# Altium footprint library Connector_Samtec_HLE_THT.PcbLib: 141 footprints (part 8 of 9)
Each footprint in its own frame and in the unit in brackets; x right, y up, seen from the top. Pads: shape width x height; smd on the part's side, far side on the other; paste and mask are expansions set on the pad; w line width, h text height; cw(c..) or ccw(c..) is an arc to the next point about the centre after c.
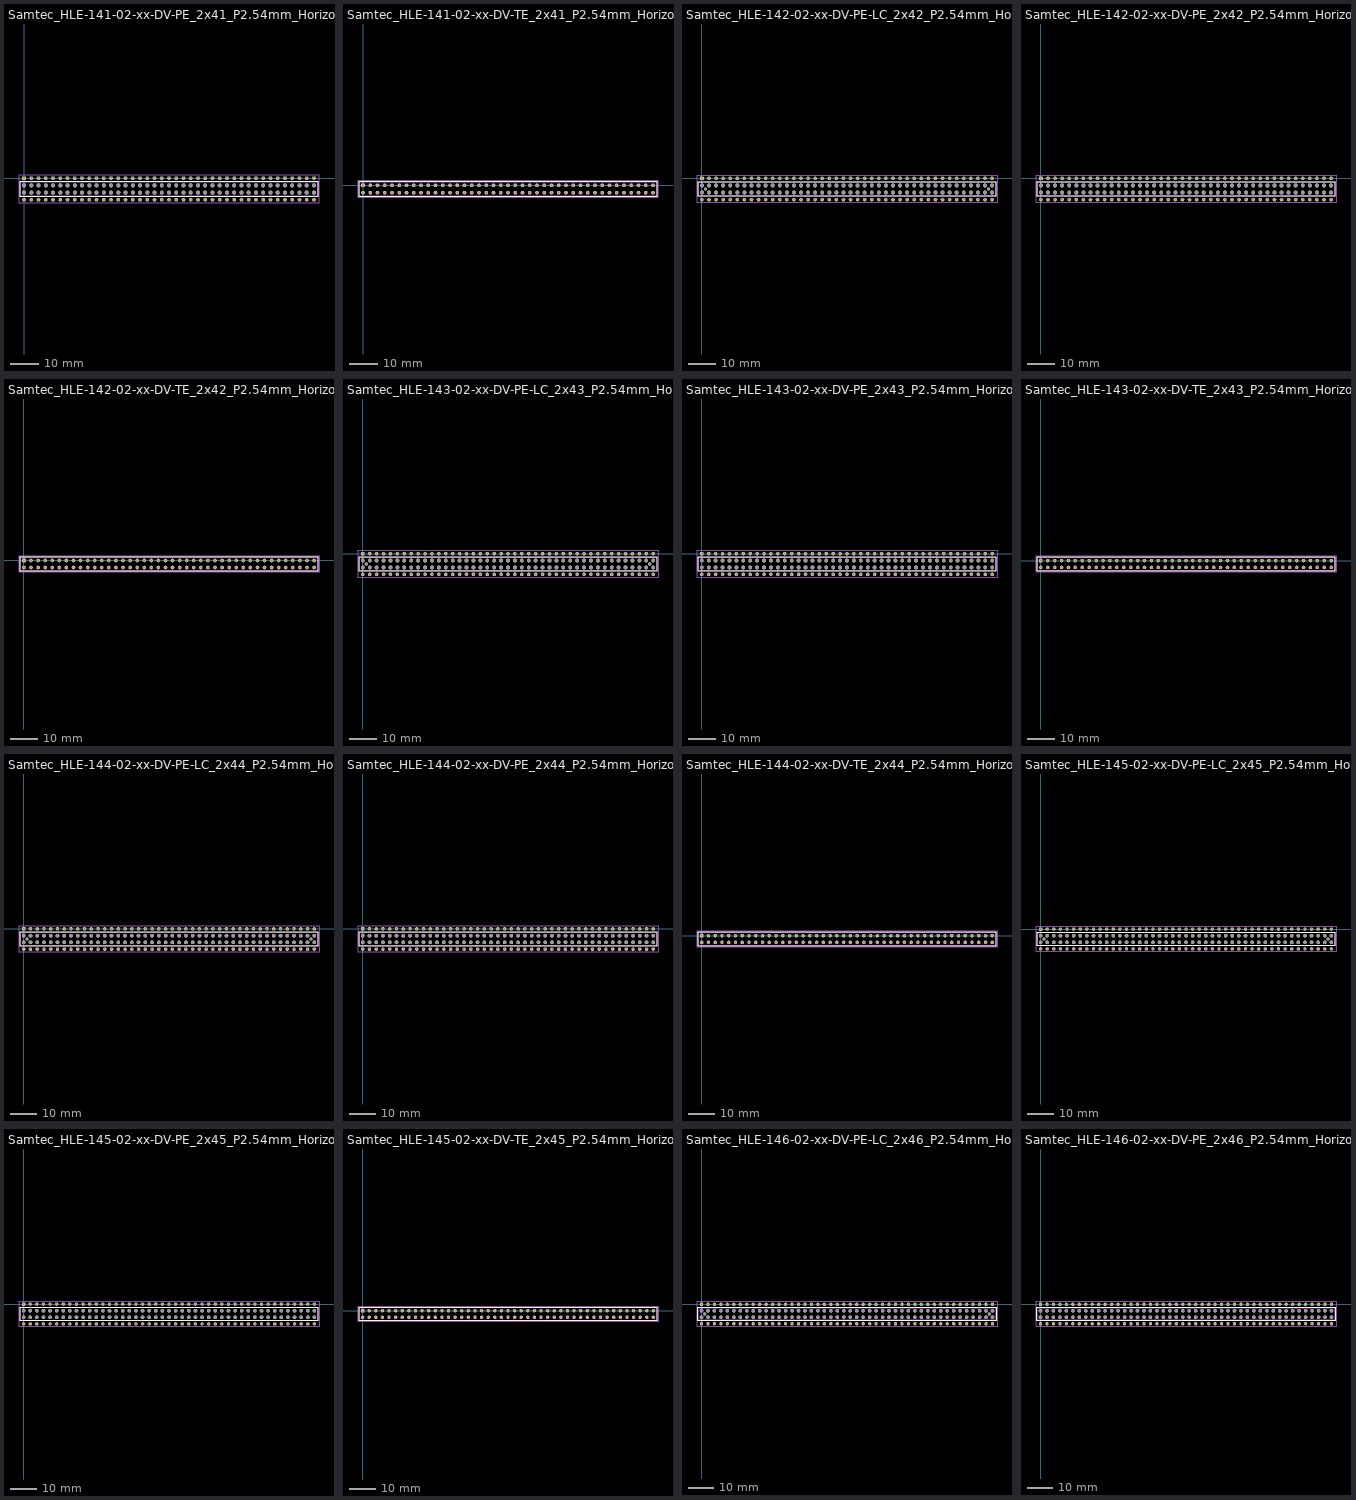
[diagram p7: the footprints below, top view; thin cyan lines are the x and y axes]

## Samtec_HLE-141-02-xx-DV-PE_2x41_P2.54mm_Horizontal [mm]
pads (164):
  rrect19% 1.31x1.31 hole 0.71: 1(0,0)
  round 1.31 hole 0.71: 2(0,-7.62) 3(2.54,0) 4(2.54,-7.62) 5(5.08,0) 6(5.08,-7.62) 7(7.62,0) 8(7.62,-7.62) 9(10.16,0) 10(10.16,-7.62) 11(12.7,0) 12(12.7,-7.62) 13(15.24,0) 14(15.24,-7.62) 15(17.78,0) 16(17.78,-7.62) 17(20.32,0) 18(20.32,-7.62) 19(22.86,0) 20(22.86,-7.62) 21(25.4,0) 22(25.4,-7.62) 23(27.94,0) 24(27.94,-7.62) 25(30.48,0) 26(30.48,-7.62) 27(33.02,0) 28(33.02,-7.62) 29(35.56,0) 30(35.56,-7.62) 31(38.1,0) 32(38.1,-7.62) 33(40.64,0) 34(40.64,-7.62) 35(43.18,0) 36(43.18,-7.62) 37(45.72,0) 38(45.72,-7.62) 39(48.26,0) 40(48.26,-7.62) 41(50.8,0) 42(50.8,-7.62) 43(53.34,0) 44(53.34,-7.62) 45(55.88,0) 46(55.88,-7.62) 47(58.42,0) 48(58.42,-7.62) 49(60.96,0) 50(60.96,-7.62) 51(63.5,0) 52(63.5,-7.62) 53(66.04,0) 54(66.04,-7.62) 55(68.58,0) 56(68.58,-7.62) 57(71.12,0) 58(71.12,-7.62) 59(73.66,0) 60(73.66,-7.62) 61(76.2,0) 62(76.2,-7.62) 63(78.74,0) 64(78.74,-7.62) 65(81.28,0) 66(81.28,-7.62) 67(83.82,0) 68(83.82,-7.62) 69(86.36,0) 70(86.36,-7.62) 71(88.9,0) 72(88.9,-7.62) 73(91.44,0) 74(91.44,-7.62) 75(93.98,0) 76(93.98,-7.62) 77(96.52,0) 78(96.52,-7.62) 79(99.06,0) 80(99.06,-7.62) 81(101.6,0) 82(101.6,-7.62)
  round 1.4 hole 1.4: Un1(83.82,-2.54) Un2(58.42,-2.54) Un3(15.24,-2.54) Un4(71.12,-5.08) Un5(10.16,-2.54) Un6(5.08,-2.54) Un7(96.52,-2.54) Un8(45.72,-5.08) Un9(88.9,-5.08) Un10(50.8,-5.08) Un11(101.6,-5.08) Un12(88.9,-2.54) Un13(35.56,-5.08) Un14(60.96,-5.08) Un15(55.88,-2.54) Un16(30.48,-5.08) Un17(33.02,-2.54) Un18(22.86,-5.08) Un19(93.98,-2.54) Un20(53.34,-2.54) Un21(86.36,-5.08) Un22(48.26,-2.54) Un23(7.62,-5.08) Un24(78.74,-5.08) Un25(96.52,-5.08) Un26(2.54,-5.08) Un27(45.72,-2.54) Un28(0,-2.54) Un29(12.7,-2.54) Un30(81.28,-5.08) Un31(68.58,-5.08) Un32(93.98,-5.08) Un33(43.18,-2.54) Un34(7.62,-2.54) Un35(91.44,-5.08) Un36(66.04,-2.54) Un37(43.18,-5.08) Un38(101.6,-2.54) Un39(48.26,-5.08) Un40(73.66,-2.54) Un41(27.94,-5.08) Un42(55.88,-5.08) Un43(76.2,-2.54) Un44(76.2,-5.08) Un45(71.12,-2.54) Un46(12.7,-5.08) Un47(17.78,-5.08) Un48(17.78,-2.54) Un49(63.5,-2.54) Un50(2.54,-2.54) Un51(68.58,-2.54) Un52(81.28,-2.54) Un53(5.08,-5.08) Un54(38.1,-5.08) Un55(40.64,-2.54) Un56(63.5,-5.08) Un57(86.36,-2.54) Un58(25.4,-5.08) Un59(20.32,-5.08) Un60(10.16,-5.08) Un61(38.1,-2.54) Un62(40.64,-5.08) Un63(78.74,-2.54) Un64(35.56,-2.54) Un65(99.06,-5.08) Un66(50.8,-2.54) Un67(53.34,-5.08) Un68(27.94,-2.54) Un69(0,-5.08) Un70(60.96,-2.54) Un71(99.06,-2.54) Un72(30.48,-2.54) Un73(73.66,-5.08) Un74(66.04,-5.08) Un75(25.4,-2.54) Un76(33.02,-5.08) Un77(58.42,-5.08) Un78(83.82,-5.08) Un79(91.44,-2.54) Un80(20.32,-2.54) Un81(22.86,-2.54) Un82(15.24,-5.08)
F.SilkS:
  lines w0.12: -1.38,-6.46 -1.38,-1.16 102.98,-1.16 102.98,-6.46 -1.38,-6.46
F.CrtYd:
  lines w0.05: -1.77,-8.78 -1.77,1.16 103.37,1.16 103.37,-8.78 -1.77,-8.78
F.Fab:
  lines w0.1: -0.5,-1.27 0,-1.977 0.5,-1.27 ; -1.27,-6.35 -1.27,-1.27 102.87,-1.27 102.87,-6.35 -1.27,-6.35
  text "'.Designator'" at 46.753,-6.49 h1

## Samtec_HLE-141-02-xx-DV-TE_2x41_P2.54mm_Horizontal [mm]
pads (82):
  rrect19% 1.31x1.31 hole 0.71: 1(0,0)
  round 1.31 hole 0.71: 2(0,-2.54) 3(2.54,0) 4(2.54,-2.54) 5(5.08,0) 6(5.08,-2.54) 7(7.62,0) 8(7.62,-2.54) 9(10.16,0) 10(10.16,-2.54) 11(12.7,0) 12(12.7,-2.54) 13(15.24,0) 14(15.24,-2.54) 15(17.78,0) 16(17.78,-2.54) 17(20.32,0) 18(20.32,-2.54) 19(22.86,0) 20(22.86,-2.54) 21(25.4,0) 22(25.4,-2.54) 23(27.94,0) 24(27.94,-2.54) 25(30.48,0) 26(30.48,-2.54) 27(33.02,0) 28(33.02,-2.54) 29(35.56,0) 30(35.56,-2.54) 31(38.1,0) 32(38.1,-2.54) 33(40.64,0) 34(40.64,-2.54) 35(43.18,0) 36(43.18,-2.54) 37(45.72,0) 38(45.72,-2.54) 39(48.26,0) 40(48.26,-2.54) 41(50.8,0) 42(50.8,-2.54) 43(53.34,0) 44(53.34,-2.54) 45(55.88,0) 46(55.88,-2.54) 47(58.42,0) 48(58.42,-2.54) 49(60.96,0) 50(60.96,-2.54) 51(63.5,0) 52(63.5,-2.54) 53(66.04,0) 54(66.04,-2.54) 55(68.58,0) 56(68.58,-2.54) 57(71.12,0) 58(71.12,-2.54) 59(73.66,0) 60(73.66,-2.54) 61(76.2,0) 62(76.2,-2.54) 63(78.74,0) 64(78.74,-2.54) 65(81.28,0) 66(81.28,-2.54) 67(83.82,0) 68(83.82,-2.54) 69(86.36,0) 70(86.36,-2.54) 71(88.9,0) 72(88.9,-2.54) 73(91.44,0) 74(91.44,-2.54) 75(93.98,0) 76(93.98,-2.54) 77(96.52,0) 78(96.52,-2.54) 79(99.06,0) 80(99.06,-2.54) 81(101.6,0) 82(101.6,-2.54)
F.SilkS:
  lines w0.12: -1.38,-3.92 102.98,-3.92 102.98,1.38 -1.38,1.38 -1.38,-3.92
F.CrtYd:
  lines w0.05: -1.77,-4.31 103.37,-4.31 103.37,1.77 -1.77,1.77 -1.77,-4.31
F.Fab:
  lines w0.1: -0.5,1.27 0,0.563 0.5,1.27 ; -1.27,-3.81 102.87,-3.81 102.87,1.27 -1.27,1.27 -1.27,-3.81
  text "'.Designator'" at 46.753,-3.95 h1

## Samtec_HLE-142-02-xx-DV-PE-LC_2x42_P2.54mm_Horizontal [mm]
pads (170):
  rrect19% 1.31x1.31 hole 0.71: 1(0,0)
  round 1.31 hole 0.71: 2(0,-7.62) 3(2.54,0) 4(2.54,-7.62) 5(5.08,0) 6(5.08,-7.62) 7(7.62,0) 8(7.62,-7.62) 9(10.16,0) 10(10.16,-7.62) 11(12.7,0) 12(12.7,-7.62) 13(15.24,0) 14(15.24,-7.62) 15(17.78,0) 16(17.78,-7.62) 17(20.32,0) 18(20.32,-7.62) 19(22.86,0) 20(22.86,-7.62) 21(25.4,0) 22(25.4,-7.62) 23(27.94,0) 24(27.94,-7.62) 25(30.48,0) 26(30.48,-7.62) 27(33.02,0) 28(33.02,-7.62) 29(35.56,0) 30(35.56,-7.62) 31(38.1,0) 32(38.1,-7.62) 33(40.64,0) 34(40.64,-7.62) 35(43.18,0) 36(43.18,-7.62) 37(45.72,0) 38(45.72,-7.62) 39(48.26,0) 40(48.26,-7.62) 41(50.8,0) 42(50.8,-7.62) 43(53.34,0) 44(53.34,-7.62) 45(55.88,0) 46(55.88,-7.62) 47(58.42,0) 48(58.42,-7.62) 49(60.96,0) 50(60.96,-7.62) 51(63.5,0) 52(63.5,-7.62) 53(66.04,0) 54(66.04,-7.62) 55(68.58,0) 56(68.58,-7.62) 57(71.12,0) 58(71.12,-7.62) 59(73.66,0) 60(73.66,-7.62) 61(76.2,0) 62(76.2,-7.62) 63(78.74,0) 64(78.74,-7.62) 65(81.28,0) 66(81.28,-7.62) 67(83.82,0) 68(83.82,-7.62) 69(86.36,0) 70(86.36,-7.62) 71(88.9,0) 72(88.9,-7.62) 73(91.44,0) 74(91.44,-7.62) 75(93.98,0) 76(93.98,-7.62) 77(96.52,0) 78(96.52,-7.62) 79(99.06,0) 80(99.06,-7.62) 81(101.6,0) 82(101.6,-7.62) 83(104.14,0) 84(104.14,-7.62)
  round 1.4 hole 1.4: Un1(10.16,-2.54) Un2(45.72,-5.08) Un3(17.78,-5.08) Un4(48.26,-5.08) Un5(48.26,-2.54) Un6(104.14,-2.54) Un7(73.66,-5.08) Un8(12.7,-5.08) Un9(60.96,-5.08) Un10(43.18,-2.54) Un11(45.72,-2.54) Un12(30.48,-5.08) Un13(68.58,-5.08) Un14(10.16,-5.08) Un15(91.44,-2.54) Un16(55.88,-5.08) Un17(40.64,-5.08) Un18(104.14,-5.08) Un19(50.8,-5.08) Un20(27.94,-5.08) Un21(20.32,-2.54) Un22(93.98,-5.08) Un23(15.24,-2.54) Un24(30.48,-2.54) Un25(38.1,-5.08) Un26(66.04,-5.08) Un28(101.6,-5.08) Un29(25.4,-5.08) Un30(40.64,-2.54) Un31(53.34,-2.54) Un32(101.6,-2.54) Un33(88.9,-2.54) Un34(93.98,-2.54) Un35(78.74,-2.54) Un36(43.18,-5.08) Un37(7.62,-5.08) Un38(99.06,-2.54) Un39(73.66,-2.54) Un40(0,-5.08) Un41(33.02,-2.54) Un42(96.52,-5.08) Un43(76.2,-2.54) Un44(22.86,-2.54) Un45(12.7,-2.54) Un46(83.82,-5.08) Un47(38.1,-2.54) Un48(86.36,-5.08) Un49(35.56,-2.54) Un50(71.12,-5.08) Un51(2.54,-2.54) Un52(22.86,-5.08) Un53(83.82,-2.54) Un55(76.2,-5.08) Un56(86.36,-2.54) Un57(78.74,-5.08) Un58(71.12,-2.54) Un59(27.94,-2.54) Un60(91.44,-5.08) Un61(2.54,-5.08) Un62(5.08,-2.54) Un63(68.58,-2.54) Un64(17.78,-2.54) Un65(88.9,-5.08) Un66(7.62,-2.54) Un67(58.42,-2.54) Un68(53.34,-5.08) Un69(58.42,-5.08) Un70(33.02,-5.08) Un71(35.56,-5.08) Un72(60.96,-2.54) Un73(99.06,-5.08) Un74(25.4,-2.54) Un75(81.28,-5.08) Un76(96.52,-2.54) Un77(0,-2.54) Un78(15.24,-5.08) Un79(20.32,-5.08) Un80(81.28,-2.54) Un81(5.08,-5.08) Un82(63.5,-5.08) Un83(50.8,-2.54) Un84(55.88,-2.54) Un85(63.5,-2.54) Un86(66.04,-2.54)
  round 1.19 hole 1.19: Un27(1.27,-3.81) Un54(102.87,-3.81)
F.SilkS:
  lines w0.12: -1.38,-6.46 -1.38,-1.16 105.52,-1.16 105.52,-6.46 -1.38,-6.46
F.CrtYd:
  lines w0.05: -1.77,-8.78 -1.77,1.16 105.91,1.16 105.91,-8.78 -1.77,-8.78
F.Fab:
  lines w0.1: -0.5,-1.27 0,-1.977 0.5,-1.27 ; -1.27,-6.35 -1.27,-1.27 105.41,-1.27 105.41,-6.35 -1.27,-6.35
  text "'.Designator'" at 48.023,-6.49 h1

## Samtec_HLE-142-02-xx-DV-PE_2x42_P2.54mm_Horizontal [mm]
pads (168):
  rrect19% 1.31x1.31 hole 0.71: 1(0,0)
  round 1.31 hole 0.71: 2(0,-7.62) 3(2.54,0) 4(2.54,-7.62) 5(5.08,0) 6(5.08,-7.62) 7(7.62,0) 8(7.62,-7.62) 9(10.16,0) 10(10.16,-7.62) 11(12.7,0) 12(12.7,-7.62) 13(15.24,0) 14(15.24,-7.62) 15(17.78,0) 16(17.78,-7.62) 17(20.32,0) 18(20.32,-7.62) 19(22.86,0) 20(22.86,-7.62) 21(25.4,0) 22(25.4,-7.62) 23(27.94,0) 24(27.94,-7.62) 25(30.48,0) 26(30.48,-7.62) 27(33.02,0) 28(33.02,-7.62) 29(35.56,0) 30(35.56,-7.62) 31(38.1,0) 32(38.1,-7.62) 33(40.64,0) 34(40.64,-7.62) 35(43.18,0) 36(43.18,-7.62) 37(45.72,0) 38(45.72,-7.62) 39(48.26,0) 40(48.26,-7.62) 41(50.8,0) 42(50.8,-7.62) 43(53.34,0) 44(53.34,-7.62) 45(55.88,0) 46(55.88,-7.62) 47(58.42,0) 48(58.42,-7.62) 49(60.96,0) 50(60.96,-7.62) 51(63.5,0) 52(63.5,-7.62) 53(66.04,0) 54(66.04,-7.62) 55(68.58,0) 56(68.58,-7.62) 57(71.12,0) 58(71.12,-7.62) 59(73.66,0) 60(73.66,-7.62) 61(76.2,0) 62(76.2,-7.62) 63(78.74,0) 64(78.74,-7.62) 65(81.28,0) 66(81.28,-7.62) 67(83.82,0) 68(83.82,-7.62) 69(86.36,0) 70(86.36,-7.62) 71(88.9,0) 72(88.9,-7.62) 73(91.44,0) 74(91.44,-7.62) 75(93.98,0) 76(93.98,-7.62) 77(96.52,0) 78(96.52,-7.62) 79(99.06,0) 80(99.06,-7.62) 81(101.6,0) 82(101.6,-7.62) 83(104.14,0) 84(104.14,-7.62)
  round 1.4 hole 1.4: Un1(63.5,-2.54) Un2(27.94,-5.08) Un3(17.78,-5.08) Un4(2.54,-2.54) Un5(73.66,-5.08) Un6(78.74,-5.08) Un7(76.2,-2.54) Un8(104.14,-2.54) Un9(96.52,-2.54) Un10(93.98,-5.08) Un11(7.62,-5.08) Un12(30.48,-2.54) Un13(55.88,-2.54) Un14(48.26,-5.08) Un15(12.7,-5.08) Un16(71.12,-2.54) Un17(93.98,-2.54) Un18(96.52,-5.08) Un19(68.58,-5.08) Un20(27.94,-2.54) Un21(50.8,-5.08) Un22(25.4,-2.54) Un23(81.28,-2.54) Un24(71.12,-5.08) Un25(83.82,-5.08) Un26(99.06,-2.54) Un27(101.6,-5.08) Un28(40.64,-5.08) Un29(66.04,-5.08) Un30(101.6,-2.54) Un31(0,-5.08) Un32(58.42,-5.08) Un33(15.24,-2.54) Un34(12.7,-2.54) Un35(15.24,-5.08) Un36(58.42,-2.54) Un37(91.44,-5.08) Un38(76.2,-5.08) Un39(38.1,-5.08) Un40(45.72,-2.54) Un41(53.34,-5.08) Un42(81.28,-5.08) Un43(7.62,-2.54) Un44(48.26,-2.54) Un45(88.9,-2.54) Un46(86.36,-2.54) Un47(63.5,-5.08) Un48(99.06,-5.08) Un49(10.16,-2.54) Un50(55.88,-5.08) Un51(43.18,-2.54) Un52(91.44,-2.54) Un53(17.78,-2.54) Un54(5.08,-5.08) Un55(38.1,-2.54) Un56(33.02,-2.54) Un57(20.32,-5.08) Un58(68.58,-2.54) Un59(22.86,-2.54) Un60(22.86,-5.08) Un61(86.36,-5.08) Un62(104.14,-5.08) Un63(30.48,-5.08) Un64(40.64,-2.54) Un65(83.82,-2.54) Un66(43.18,-5.08) Un67(35.56,-5.08) Un68(53.34,-2.54) Un69(66.04,-2.54) Un70(35.56,-2.54) Un71(0,-2.54) Un72(25.4,-5.08) Un73(20.32,-2.54) Un74(2.54,-5.08) Un75(60.96,-2.54) Un76(50.8,-2.54) Un77(10.16,-5.08) Un78(60.96,-5.08) Un79(88.9,-5.08) Un80(45.72,-5.08) Un81(73.66,-2.54) Un82(5.08,-2.54) Un83(78.74,-2.54) Un84(33.02,-5.08)
F.SilkS:
  lines w0.12: -1.38,-6.46 -1.38,-1.16 105.52,-1.16 105.52,-6.46 -1.38,-6.46
F.CrtYd:
  lines w0.05: -1.77,-8.78 105.91,-8.78 105.91,1.16 -1.77,1.16 -1.77,-8.78
F.Fab:
  lines w0.1: -0.5,-1.27 0,-1.977 0.5,-1.27 ; -1.27,-6.35 -1.27,-1.27 105.41,-1.27 105.41,-6.35 -1.27,-6.35
  text "'.Designator'" at 48.023,-6.49 h1

## Samtec_HLE-142-02-xx-DV-TE_2x42_P2.54mm_Horizontal [mm]
pads (84):
  rrect19% 1.31x1.31 hole 0.71: 1(0,0)
  round 1.31 hole 0.71: 2(0,-2.54) 3(2.54,0) 4(2.54,-2.54) 5(5.08,0) 6(5.08,-2.54) 7(7.62,0) 8(7.62,-2.54) 9(10.16,0) 10(10.16,-2.54) 11(12.7,0) 12(12.7,-2.54) 13(15.24,0) 14(15.24,-2.54) 15(17.78,0) 16(17.78,-2.54) 17(20.32,0) 18(20.32,-2.54) 19(22.86,0) 20(22.86,-2.54) 21(25.4,0) 22(25.4,-2.54) 23(27.94,0) 24(27.94,-2.54) 25(30.48,0) 26(30.48,-2.54) 27(33.02,0) 28(33.02,-2.54) 29(35.56,0) 30(35.56,-2.54) 31(38.1,0) 32(38.1,-2.54) 33(40.64,0) 34(40.64,-2.54) 35(43.18,0) 36(43.18,-2.54) 37(45.72,0) 38(45.72,-2.54) 39(48.26,0) 40(48.26,-2.54) 41(50.8,0) 42(50.8,-2.54) 43(53.34,0) 44(53.34,-2.54) 45(55.88,0) 46(55.88,-2.54) 47(58.42,0) 48(58.42,-2.54) 49(60.96,0) 50(60.96,-2.54) 51(63.5,0) 52(63.5,-2.54) 53(66.04,0) 54(66.04,-2.54) 55(68.58,0) 56(68.58,-2.54) 57(71.12,0) 58(71.12,-2.54) 59(73.66,0) 60(73.66,-2.54) 61(76.2,0) 62(76.2,-2.54) 63(78.74,0) 64(78.74,-2.54) 65(81.28,0) 66(81.28,-2.54) 67(83.82,0) 68(83.82,-2.54) 69(86.36,0) 70(86.36,-2.54) 71(88.9,0) 72(88.9,-2.54) 73(91.44,0) 74(91.44,-2.54) 75(93.98,0) 76(93.98,-2.54) 77(96.52,0) 78(96.52,-2.54) 79(99.06,0) 80(99.06,-2.54) 81(101.6,0) 82(101.6,-2.54) 83(104.14,0) 84(104.14,-2.54)
F.SilkS:
  lines w0.12: -1.38,-3.92 105.52,-3.92 105.52,1.38 -1.38,1.38 -1.38,-3.92
F.CrtYd:
  lines w0.05: -1.77,-4.31 105.91,-4.31 105.91,1.77 -1.77,1.77 -1.77,-4.31
F.Fab:
  lines w0.1: -0.5,1.27 0,0.563 0.5,1.27 ; -1.27,-3.81 -1.27,1.27 105.41,1.27 105.41,-3.81 -1.27,-3.81
  text "'.Designator'" at 48.023,-3.95 h1

## Samtec_HLE-143-02-xx-DV-PE-LC_2x43_P2.54mm_Horizontal [mm]
pads (174):
  rrect19% 1.31x1.31 hole 0.71: 1(0,0)
  round 1.31 hole 0.71: 2(0,-7.62) 3(2.54,0) 4(2.54,-7.62) 5(5.08,0) 6(5.08,-7.62) 7(7.62,0) 8(7.62,-7.62) 9(10.16,0) 10(10.16,-7.62) 11(12.7,0) 12(12.7,-7.62) 13(15.24,0) 14(15.24,-7.62) 15(17.78,0) 16(17.78,-7.62) 17(20.32,0) 18(20.32,-7.62) 19(22.86,0) 20(22.86,-7.62) 21(25.4,0) 22(25.4,-7.62) 23(27.94,0) 24(27.94,-7.62) 25(30.48,0) 26(30.48,-7.62) 27(33.02,0) 28(33.02,-7.62) 29(35.56,0) 30(35.56,-7.62) 31(38.1,0) 32(38.1,-7.62) 33(40.64,0) 34(40.64,-7.62) 35(43.18,0) 36(43.18,-7.62) 37(45.72,0) 38(45.72,-7.62) 39(48.26,0) 40(48.26,-7.62) 41(50.8,0) 42(50.8,-7.62) 43(53.34,0) 44(53.34,-7.62) 45(55.88,0) 46(55.88,-7.62) 47(58.42,0) 48(58.42,-7.62) 49(60.96,0) 50(60.96,-7.62) 51(63.5,0) 52(63.5,-7.62) 53(66.04,0) 54(66.04,-7.62) 55(68.58,0) 56(68.58,-7.62) 57(71.12,0) 58(71.12,-7.62) 59(73.66,0) 60(73.66,-7.62) 61(76.2,0) 62(76.2,-7.62) 63(78.74,0) 64(78.74,-7.62) 65(81.28,0) 66(81.28,-7.62) 67(83.82,0) 68(83.82,-7.62) 69(86.36,0) 70(86.36,-7.62) 71(88.9,0) 72(88.9,-7.62) 73(91.44,0) 74(91.44,-7.62) 75(93.98,0) 76(93.98,-7.62) 77(96.52,0) 78(96.52,-7.62) 79(99.06,0) 80(99.06,-7.62) 81(101.6,0) 82(101.6,-7.62) 83(104.14,0) 84(104.14,-7.62) 85(106.68,0) 86(106.68,-7.62)
  round 1.4 hole 1.4: Un1(50.8,-2.54) Un2(78.74,-2.54) Un3(91.44,-2.54) Un4(93.98,-2.54) Un5(38.1,-5.08) Un6(22.86,-2.54) Un7(22.86,-5.08) Un8(20.32,-2.54) Un9(43.18,-2.54) Un10(55.88,-2.54) Un11(55.88,-5.08) Un12(10.16,-2.54) Un13(101.6,-2.54) Un14(88.9,-2.54) Un15(45.72,-5.08) Un16(99.06,-2.54) Un17(81.28,-2.54) Un18(35.56,-5.08) Un19(76.2,-5.08) Un20(58.42,-5.08) Un21(17.78,-2.54) Un22(48.26,-2.54) Un23(68.58,-5.08) Un24(12.7,-5.08) Un25(91.44,-5.08) Un26(104.14,-2.54) Un27(38.1,-2.54) Un28(83.82,-5.08) Un29(10.16,-5.08) Un30(53.34,-5.08) Un31(33.02,-2.54) Un32(60.96,-2.54) Un35(20.32,-5.08) Un36(40.64,-2.54) Un37(43.18,-5.08) Un38(40.64,-5.08) Un39(63.5,-2.54) Un40(35.56,-2.54) Un41(86.36,-5.08) Un42(7.62,-5.08) Un43(0,-5.08) Un44(25.4,-5.08) Un45(68.58,-2.54) Un46(5.08,-5.08) Un47(81.28,-5.08) Un48(60.96,-5.08) Un49(30.48,-2.54) Un50(104.14,-5.08) Un51(15.24,-2.54) Un52(12.7,-2.54) Un53(66.04,-2.54) Un54(96.52,-5.08) Un55(7.62,-2.54) Un56(45.72,-2.54) Un57(86.36,-2.54) Un58(0,-2.54) Un59(58.42,-2.54) Un60(73.66,-2.54) Un61(106.68,-5.08) Un62(15.24,-5.08) Un63(63.5,-5.08) Un64(88.9,-5.08) Un65(106.68,-2.54) Un66(27.94,-5.08) Un67(2.54,-5.08) Un68(78.74,-5.08) Un69(71.12,-2.54) Un70(71.12,-5.08) Un71(50.8,-5.08) Un72(48.26,-5.08) Un73(96.52,-2.54) Un74(30.48,-5.08) Un75(5.08,-2.54) Un76(66.04,-5.08) Un77(73.66,-5.08) Un78(33.02,-5.08) Un79(76.2,-2.54) Un80(101.6,-5.08) Un81(17.78,-5.08) Un82(99.06,-5.08) Un83(83.82,-2.54) Un84(25.4,-2.54) Un85(2.54,-2.54) Un86(27.94,-2.54) Un87(93.98,-5.08) Un88(53.34,-2.54)
  round 1.19 hole 1.19: Un33(1.27,-3.81) Un34(105.41,-3.81)
F.SilkS:
  lines w0.12: -1.38,-6.46 -1.38,-1.16 108.06,-1.16 108.06,-6.46 -1.38,-6.46
F.CrtYd:
  lines w0.05: -1.77,-8.78 -1.77,1.16 108.45,1.16 108.45,-8.78 -1.77,-8.78
F.Fab:
  lines w0.1: -0.5,-1.27 0,-1.977 0.5,-1.27 ; -1.27,-6.35 -1.27,-1.27 107.95,-1.27 107.95,-6.35 -1.27,-6.35
  text "'.Designator'" at 49.293,-6.49 h1

## Samtec_HLE-143-02-xx-DV-PE_2x43_P2.54mm_Horizontal [mm]
pads (172):
  rrect19% 1.31x1.31 hole 0.71: 1(0,0)
  round 1.31 hole 0.71: 2(0,-7.62) 3(2.54,0) 4(2.54,-7.62) 5(5.08,0) 6(5.08,-7.62) 7(7.62,0) 8(7.62,-7.62) 9(10.16,0) 10(10.16,-7.62) 11(12.7,0) 12(12.7,-7.62) 13(15.24,0) 14(15.24,-7.62) 15(17.78,0) 16(17.78,-7.62) 17(20.32,0) 18(20.32,-7.62) 19(22.86,0) 20(22.86,-7.62) 21(25.4,0) 22(25.4,-7.62) 23(27.94,0) 24(27.94,-7.62) 25(30.48,0) 26(30.48,-7.62) 27(33.02,0) 28(33.02,-7.62) 29(35.56,0) 30(35.56,-7.62) 31(38.1,0) 32(38.1,-7.62) 33(40.64,0) 34(40.64,-7.62) 35(43.18,0) 36(43.18,-7.62) 37(45.72,0) 38(45.72,-7.62) 39(48.26,0) 40(48.26,-7.62) 41(50.8,0) 42(50.8,-7.62) 43(53.34,0) 44(53.34,-7.62) 45(55.88,0) 46(55.88,-7.62) 47(58.42,0) 48(58.42,-7.62) 49(60.96,0) 50(60.96,-7.62) 51(63.5,0) 52(63.5,-7.62) 53(66.04,0) 54(66.04,-7.62) 55(68.58,0) 56(68.58,-7.62) 57(71.12,0) 58(71.12,-7.62) 59(73.66,0) 60(73.66,-7.62) 61(76.2,0) 62(76.2,-7.62) 63(78.74,0) 64(78.74,-7.62) 65(81.28,0) 66(81.28,-7.62) 67(83.82,0) 68(83.82,-7.62) 69(86.36,0) 70(86.36,-7.62) 71(88.9,0) 72(88.9,-7.62) 73(91.44,0) 74(91.44,-7.62) 75(93.98,0) 76(93.98,-7.62) 77(96.52,0) 78(96.52,-7.62) 79(99.06,0) 80(99.06,-7.62) 81(101.6,0) 82(101.6,-7.62) 83(104.14,0) 84(104.14,-7.62) 85(106.68,0) 86(106.68,-7.62)
  round 1.4 hole 1.4: Un1(30.48,-2.54) Un2(17.78,-5.08) Un3(91.44,-2.54) Un4(12.7,-2.54) Un5(20.32,-5.08) Un6(33.02,-2.54) Un7(20.32,-2.54) Un8(38.1,-2.54) Un9(99.06,-2.54) Un10(78.74,-5.08) Un11(43.18,-5.08) Un12(78.74,-2.54) Un13(38.1,-5.08) Un14(53.34,-5.08) Un15(27.94,-2.54) Un16(73.66,-2.54) Un17(10.16,-2.54) Un18(45.72,-5.08) Un19(53.34,-2.54) Un20(43.18,-2.54) Un21(63.5,-2.54) Un22(27.94,-5.08) Un23(101.6,-2.54) Un24(58.42,-5.08) Un25(76.2,-2.54) Un26(71.12,-2.54) Un27(35.56,-2.54) Un28(58.42,-2.54) Un29(93.98,-2.54) Un30(7.62,-5.08) Un31(12.7,-5.08) Un32(71.12,-5.08) Un33(25.4,-2.54) Un34(15.24,-5.08) Un35(81.28,-5.08) Un36(68.58,-2.54) Un37(76.2,-5.08) Un38(73.66,-5.08) Un39(5.08,-5.08) Un40(33.02,-5.08) Un41(45.72,-2.54) Un42(101.6,-5.08) Un43(66.04,-2.54) Un44(35.56,-5.08) Un45(10.16,-5.08) Un46(88.9,-5.08) Un47(60.96,-2.54) Un48(5.08,-2.54) Un49(22.86,-2.54) Un50(50.8,-5.08) Un51(22.86,-5.08) Un52(2.54,-2.54) Un53(55.88,-2.54) Un54(30.48,-5.08) Un55(96.52,-2.54) Un56(104.14,-5.08) Un57(88.9,-2.54) Un58(96.52,-5.08) Un59(40.64,-2.54) Un60(99.06,-5.08) Un61(50.8,-2.54) Un62(7.62,-2.54) Un63(83.82,-5.08) Un64(55.88,-5.08) Un65(2.54,-5.08) Un66(0,-5.08) Un67(15.24,-2.54) Un68(91.44,-5.08) Un69(48.26,-5.08) Un70(86.36,-2.54) Un71(60.96,-5.08) Un72(40.64,-5.08) Un73(93.98,-5.08) Un74(83.82,-2.54) Un75(86.36,-5.08) Un76(106.68,-2.54) Un77(66.04,-5.08) Un78(48.26,-2.54) Un79(25.4,-5.08) Un80(17.78,-2.54) Un81(81.28,-2.54) Un82(63.5,-5.08) Un83(0,-2.54) Un84(68.58,-5.08) Un85(106.68,-5.08) Un86(104.14,-2.54)
F.SilkS:
  lines w0.12: -1.38,-6.46 -1.38,-1.16 108.06,-1.16 108.06,-6.46 -1.38,-6.46
F.CrtYd:
  lines w0.05: -1.77,-8.78 108.45,-8.78 108.45,1.16 -1.77,1.16 -1.77,-8.78
F.Fab:
  lines w0.1: -0.5,-1.27 0,-1.977 0.5,-1.27 ; -1.27,-6.35 -1.27,-1.27 107.95,-1.27 107.95,-6.35 -1.27,-6.35
  text "'.Designator'" at 49.293,-6.49 h1
